# Altium footprint library andylib.PcbLib: 158 footprints (part 4 of 10)
Each footprint in its own frame and in the unit in brackets; x right, y up, seen from the top. Pads: shape width x height; smd on the part's side, far side on the other; paste and mask are expansions set on the pad; w line width, h text height; cw(c..) or ccw(c..) is an arc to the next point about the centre after c.
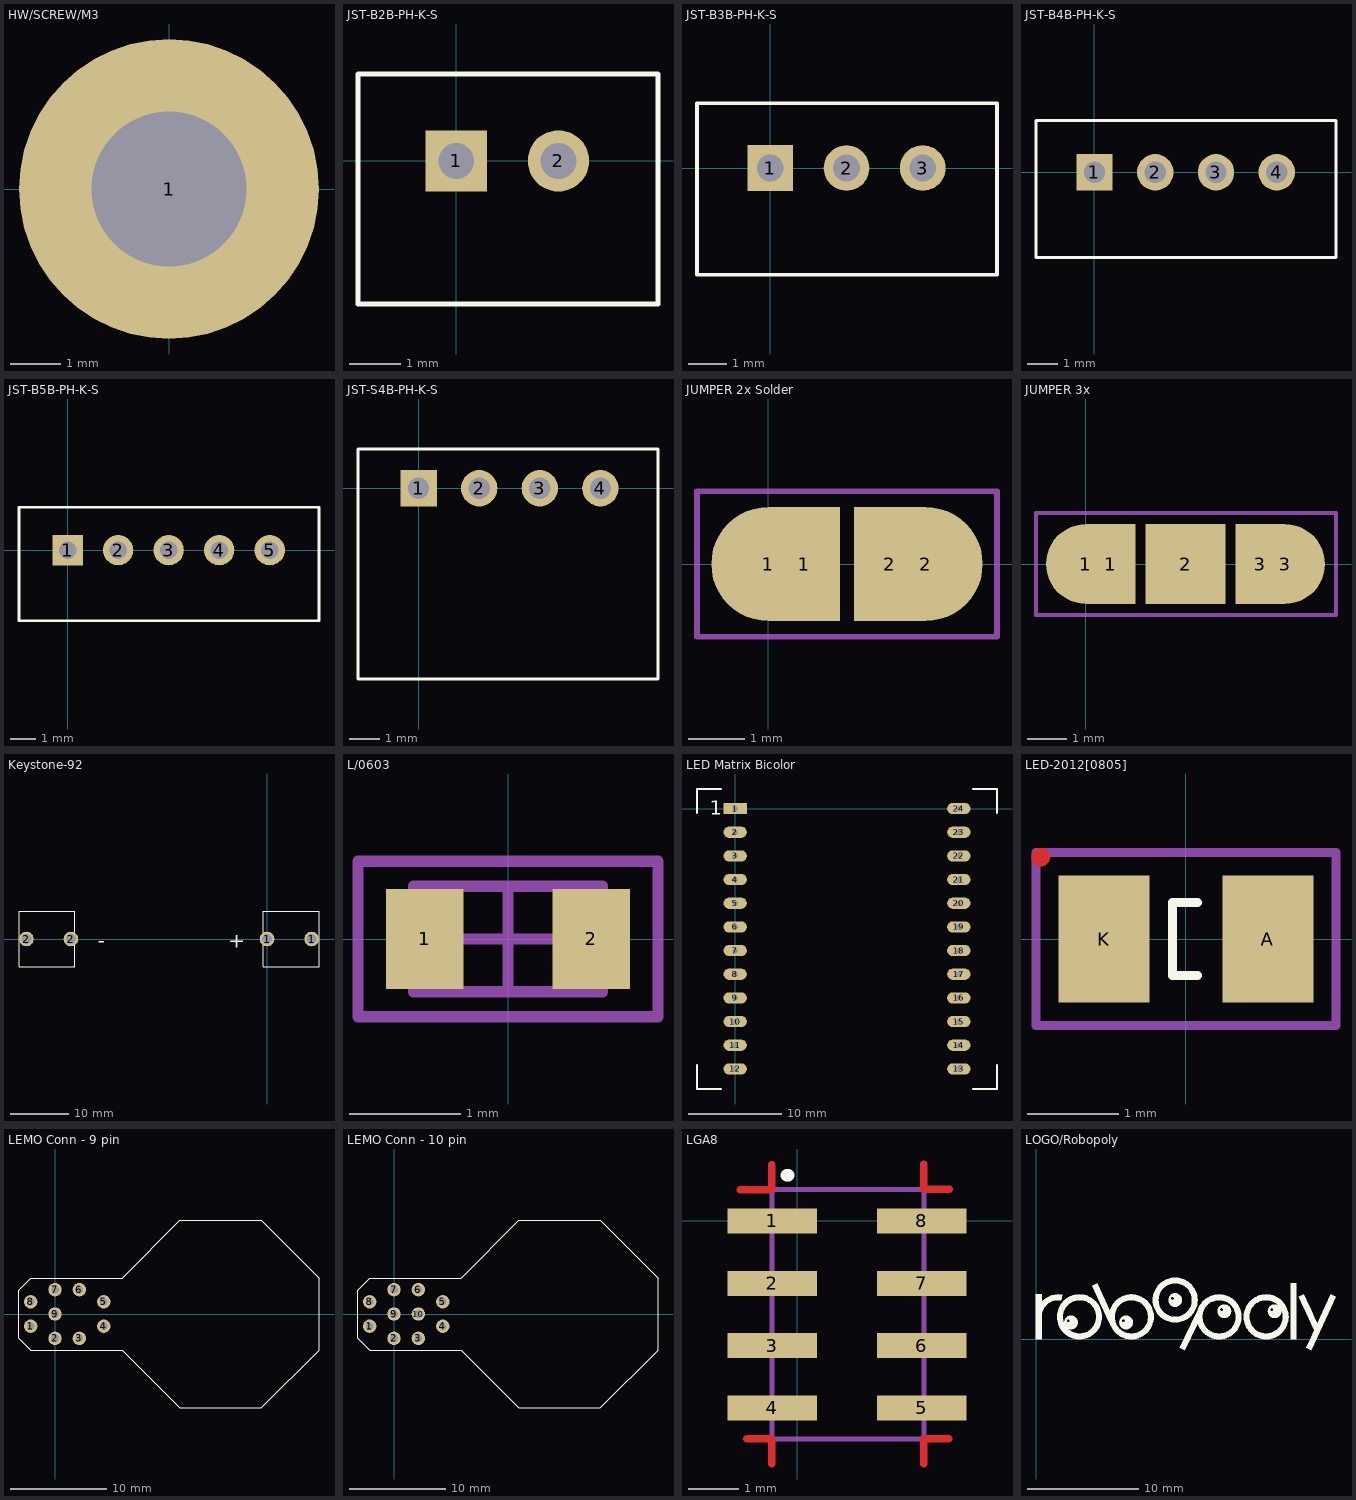
[diagram p3: the footprints below, top view; thin cyan lines are the x and y axes]

## HW/SCREW/M3 [mm]
pads (1):
  round 6 / inner round 4 / far side round 4 hole 3.1: 1(0,0)
3D body: height 2.5, standoff -4, extent -2.235,-2.235 2.265,2.265

## JST-B2B-PH-K-S [mm] "JST Shrouded SMT Side-entry Header, 4 pins"
pads (2):
  rect 1.2x1.2 hole 0.7: 1(0,0)
  round 1.2 hole 0.7: 2(2,0)
Top Overlay:
  lines w0.1: -1.925,-2.8 3.95,-2.8 3.95,1.7 -1.925,1.7 -1.925,-2.8
3D body: height 6, standoff -3.4, extent -1.925,-2.775 3.975,1.725

## JST-B3B-PH-K-S [mm] "JST Shrouded SMT Side-entry Header, 3 pins"
pads (3):
  rect 1.2x1.2 hole 0.7: 1(0,0)
  round 1.2 hole 0.7: 2(2,0) 3(4,0)
Top Overlay:
  lines w0.1: -1.925,-2.8 5.95,-2.8 5.95,1.7 -1.925,1.7 -1.925,-2.8
3D body: height 6, standoff -1.91, extent -1.943,-2.783 6.057,1.717

## JST-B4B-PH-K-S [mm] "JST Shrouded SMT Side-entry Header, 4 pins"
pads (4):
  rect 1.2x1.2 hole 0.7: 1(0,0)
  round 1.2 hole 0.7: 2(2,0) 3(4,0) 4(6,0)
Top Overlay:
  lines w0.1: -1.925,-2.8 7.95,-2.8 7.95,1.7 -1.925,1.7 -1.925,-2.8
3D body: height 6, standoff -3.4, extent -1.95,-2.8 7.95,1.7

## JST-B5B-PH-K-S [mm] "JST Shrouded SMT Side-entry Header, 4 pins"
pads (5):
  rect 1.2x1.2 hole 0.7: 1(0,0)
  round 1.2 hole 0.7: 2(2,0) 3(4,0) 4(6,0) 5(8,0)
Top Overlay:
  lines w0.1: -1.925,-2.8 -1.925,1.7 9.95,1.7 9.95,-2.8 -1.925,-2.8
3D body: height 6, standoff -3.4, extent -1.9,-2.775 10,1.725

## JST-S4B-PH-K-S [mm] "JST Shrouded SMT Side-entry Header, 4 pins"
pads (4):
  rect 1.2x1.2 hole 0.7: 1(0,0)
  round 1.2 hole 0.7: 2(2,0) 3(4,0) 4(6,0)
Top Overlay:
  lines w0.1: -2,-6.3 -2,1.3 7.9,1.3 7.9,-6.3 -2,-6.3
3D body: height 5.5, standoff -0.1, extent -3,-6.3 8.9,2.3

## JUMPER 2x Solder [mil]
pads (4):
  round 80 smd: 1(0,0) 2(110,0)
  rect 50x80 smd: 1(25,0) 2(85,0)
Mechanical 13:
  lines w3.94: -50,-51 -50,51 160,51 160,-51 -50,-51

## JUMPER 3x [mil]
pads (5):
  round 80 smd: 1(0,0) 3(200,0)
  rect 50x80 smd paste+0: 1(25,0) 3(175,0)
  rect 80x80 smd paste+0: 2(100,0)
Top Solder:
  rectangle: 144,-44 146,44
  rectangle: 54,-44 56,44
Mechanical 13:
  lines w3.94: -50,-51 -50,51 251,51 251,-51 -50,-51

## Keystone-92 [mm] "AA Battery Clip"
height 9
pads (4):
  round 2.5 hole 1.7: 1(0,0) 1(7.62,0) 2(-41.148,0) 2(-33.528,0)
Top Overlay:
  lines w0.1: -42.418,-4.775 -32.893,-4.775 ; -42.418,-4.763 -42.418,4.763 ; -42.418,4.775 -32.893,4.775 ; -32.893,-4.763 -32.893,4.763 ; -0.635,-4.775 8.89,-4.775 ; -0.635,-4.763 -0.635,4.763 ; -0.635,4.775 8.89,4.775 ; 8.89,-4.763 8.89,4.763
  text "-" at -28.956,-1.524 h2.54
  text "+" at -6.604,-1.524 h2.54
3D body: height 16.34, standoff -0.3, extent -0.624,-7.874 8.89,7.886
3D body: height 16.34, standoff -0.3, extent -42.534,-7.88 -33.02,7.88
3D body: height 16, standoff 1.5, extent -41.889,-7.366 8.361,7.135

## L/0603 [mm] "Chip Inductor, Body 1.6x0.8mm, IPC High Density"
height 0.9
pads (2):
  rect 0.7x0.9 smd: 1(-0.75,0) 2(0.75,0)
Mechanical 13:
  lines w0.1: -0.85,-0.475 0.85,-0.475 0.85,0.475 -0.85,0.475 -0.85,-0.475
Mechanical 15:
  lines w0.1: -0.475,0 0.475,0 ; 0,-0.475 0,0.475 ; -1.35,-0.7 1.35,-0.7 1.35,0.7 -1.35,0.7 -1.35,-0.7
3D body: height 0.3, standoff 0, extent -0.8,-0.4 0.8,0.4

## LED Matrix Bicolor [mm]
pads (24):
  rect 2.5x1.2 hole 0.6: 1(0,0)
  oval 2.5x1.2 hole 0.6: 2(0,-2.54) 3(0,-5.08) 4(0,-7.62) 5(0,-10.16) 6(0,-12.7) 7(0,-15.24) 8(0,-17.78) 9(0,-20.32) 10(0,-22.86) 11(0,-25.4) 12(0,-27.94) 13(24,-27.94) 14(24,-25.4) 15(24,-22.86) 16(24,-20.32) 17(24,-17.78) 18(24,-15.24) 19(24,-12.7) 20(24,-10.16) 21(24,-7.62) 22(24,-5.08) 23(24,-2.54) 24(24,0)
Top Overlay:
  lines w0.2: -4.1,-27.5 -4.1,-30.1 -1.5,-30.1 ; -4.1,-0.5 -4.1,2.1 -1.5,2.1 ; 25.5,-30.1 28.1,-30.1 28.1,-27.5 ; 25.5,2.1 28.1,2.1 28.1,-0.5
  text "1" at -2.75,-0.65 h1.52
3D body: height 8, standoff -6, extent -4,-30 28,2

## LED-2012[0805] [mm] "SMD LED - 0805 package"
height 2.54
pads (2):
  rect 1x1.4 smd: A(0.9,0) K(-0.9,0)
Top Layer:
  lines w0.203: -1.6,0.9 -1.6,0.9
Top Overlay:
  lines w0.1: 0.125,-0.4 -0.15,-0.4 -0.15,0.4 0.125,0.4
Mechanical 15:
  lines w0.1: -1.65,-0.95 1.65,-0.95 1.65,0.95 -1.65,0.95 -1.65,-0.95
3D body: height 0.84, standoff 0, extent -1.031,-0.456 1.031,0.45

## LEMO Conn - 9 pin [mm] "9 pin LEMO Socket - 90°"
pads (9):
  round 1.4 hole 0.8: 1(-2.54,-1.27) 2(0,-2.54) 3(2.54,-2.54) 4(5.08,-1.27) 5(5.08,1.27) 6(2.54,2.54) 7(0,2.54) 8(-2.54,1.27) 9(0,0)
Top Overlay:
  lines w0.1: -3.75,-2.5 -3.75,2.5 -2.5,3.75 7,3.75 13,9.75 21.5,9.75 27.5,3.75 27.5,-3.75 21.5,-9.75 13,-9.75 7,-3.75 -2.5,-3.75 -3.75,-2.5
3D body: height 24.75, standoff -5, extent -3.632,-9.275 27.928,9.225

## LEMO Conn - 10 pin [mm] "10 pin LEMO Socket - 90°"
pads (10):
  round 1.4 hole 0.8: 1(-2.54,-1.27) 2(0,-2.54) 3(2.54,-2.54) 4(5.08,-1.27) 5(5.08,1.27) 6(2.54,2.54) 7(0,2.54) 8(-2.54,1.27) 9(0,0) 10(2.54,0)
Top Overlay:
  lines w0.1: -3.75,-2.5 -3.75,2.5 -2.5,3.75 7,3.75 13,9.75 21.5,9.75 27.5,3.75 27.5,-3.75 21.5,-9.75 13,-9.75 7,-3.75 -2.5,-3.75 -3.75,-2.5
3D body: height 20, standoff 0, extent -3.751,-9.751 27.501,9.751

## LGA8 [mm] "LGA 8 Footprint for I2C barometer"
height 1.2
pads (8):
  rect 1.8x0.5 smd: 1(-0.5,0) 2(-0.5,-1.25) 3(-0.5,-2.5) 4(-0.5,-3.75) 5(2.5,-3.75) 6(2.5,-2.5) 7(2.5,-1.25) 8(2.5,0)
Top Layer:
  lines w0.15: -1.143,0.625 -0.508,0.625 -0.508,1.125 ; -1.014,-4.369 -0.514,-4.369 ; -0.508,-4.875 -0.508,-4.375 ; 2.54,-4.875 2.54,-4.369 3.046,-4.369 ; 2.54,1.143 2.54,0.635 3.048,0.635
  text "." at -1.016,0.762 h2
Top Overlay:
  lines w0.254: -0.203,0.914 -0.178,0.914
Mechanical 13:
  lines w0.1: -0.508,-4.369 2.54,-4.369 2.54,0.635 -0.508,0.635 -0.508,-4.369
3D body: height 1.2, standoff 0, extent -0.509,-4.38 2.491,0.62

## LOGO/Robopoly [mm] "Robopoly Logo"
Top Overlay:
  drawing of 3442 lines, arcs and shapes, not listed